# Altium footprint library Power_Lib_Altium.PcbLib: 383 footprints (part 3 of 24)
Each footprint in its own frame and in the unit in brackets; x right, y up, seen from the top. Pads: shape width x height; smd on the part's side, far side on the other; paste and mask are expansions set on the pad; w line width, h text height; cw(c..) or ccw(c..) is an arc to the next point about the centre after c.
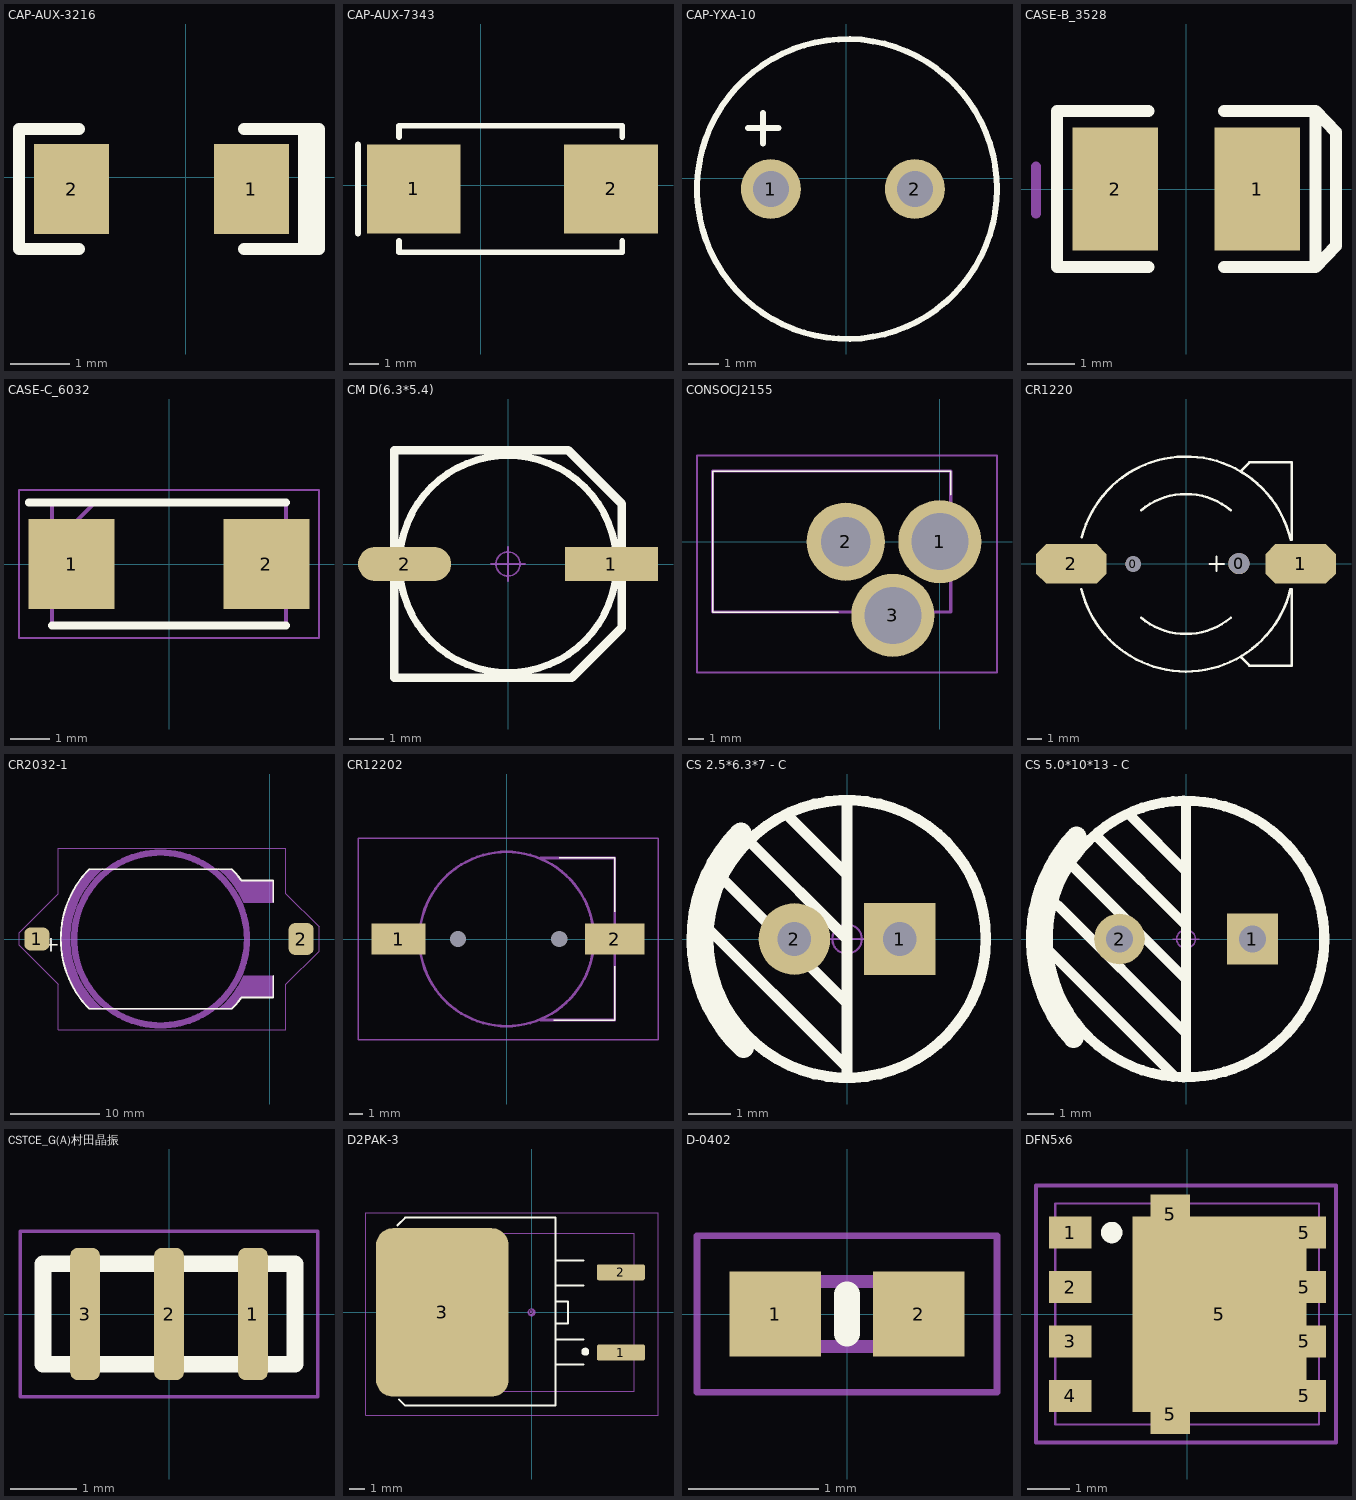
[diagram p2: the footprints below, top view; thin cyan lines are the x and y axes]

## CAP-AUX-3216 [mil] "钽电容1206大小"
pads (2):
  rect 50x60 smd: 1(44,-8) 2(-76,-8)
Top Overlay:
  lines w7.87: -111,-48 -71,-48 ; -111,32 -71,32 ; 39,-48 89,-48 ; 39,32 89,32
  lines w8: -111,-48 -111,32 ; 79,-48 79,32 ; 84,-48 84,32 ; 89,-48 89,32
3D body "User Library-CAP_TANT_3216-18_A_case-1.SLDPRT": height 66.93, standoff 0, extent -81.93,-45 51.93,25.87

## CAP-AUX-7343 [mm] "贴片7343钽电容"
pads (2):
  rect 3.2x3.05 smd: 1(-2.286,-0.127) 2(4.445,-0.127)
Top Overlay:
  lines w0.2: -4.191,-1.651 -4.191,1.397 ; -2.794,-1.905 -2.794,-2.286 4.826,-2.286 4.826,-1.905 ; -2.794,1.651 -2.794,2.032 4.826,2.032 4.826,1.651
3D body "User Library-AVX_E_CASE.SLDPRT": height 4.2, standoff 0, extent -2.684,-2.352 4.716,2.098

## CAP-YXA-10 [mm]
pads (2):
  round 2 hole 1.2: 1(-2.515,-0.356) 2(2.285,-0.356)
Top Overlay:
  circle w0.2: c0.025,-0.356 r5
  lines w0.2: -3.277,1.676 -2.261,1.676 ; -2.769,1.168 -2.769,2.184

## CASE-B_3528 [mm]
pads (2):
  rect 1.8x2.6 smd: 1(1.5,0) 2(-1.5,0)
Top Overlay:
  lines w0.254: -0.8,-1.65 -2.727,-1.65 -2.727,1.65 -0.8,1.65 ; 0.8,-1.65 2.727,-1.65 ; 0.8,1.65 2.727,1.65 ; 2.727,-1.65 3.163,-1.2 3.163,1.2 2.727,1.65 ; 2.727,-1.65 2.727,1.65
Mechanical 15:
  lines w0.203: -3.175,-0.525 -3.175,0.475
3D body "User Library-AVX_BCASE.STEP": height 2.03, standoff 0, extent -1.85,-1.465 1.85,1.465

## CASE-C_6032 [mm]
pads (2):
  rect 2.2x2.3 smd: 1(-2.5,0) 2(2.5,0)
Top Overlay:
  lines w0.2: -3.6,1.575 3,1.575 ; -3,-1.575 3,-1.575
Mechanical 13:
  lines w0.1: -3,0.475 -1.9,1.575 ; -3,-1.575 3,-1.575 3,1.575 -3,1.575 -3,-1.575
Mechanical 15:
  lines w0.05: -3.85,-1.9 3.85,-1.9 3.85,1.9 -3.85,1.9 -3.85,-1.9
3D body "TAJC226K025RNJ.stp": height 2.8, standoff 0, extent -3,-1.575 3,1.575

## CM D(6.3*5.4) [mm] "贴片电解电容，直径6.3mm，高5.4mm"
height 5.4
pads (2):
  rect 2.7x1 smd: 1(3,0)
  oval 2.7x1 smd: 2(-3,0)
Top Overlay:
  circle w0.2: c0,0 r3.15
  lines w0.254: -3.3,-3.3 1.85,-3.3 3.3,-1.85 3.3,1.75 1.75,3.3 -3.3,3.3 -3.3,-3.3
Mechanical 15:
  circle w0.05: c0,0 r0.35
  lines w0.05: -0.5,0 0.5,0 ; 0,-0.5 0,0.5
3D body "CM D(6.3X5.4).STEP": height 5.4, standoff -0.01, extent -3.5,-3.3 3.5,3.3

## CONSOCJ2155 [mm]
pads (3):
  round 5.3 hole 3.64: 1(0,0) 3(-3,-4.7)
  round 5 hole 3.162: 2(-6,0)
Top Overlay:
  lines w0.1: -6.5,-4.5 -14.5,-4.5 -14.5,4.5 0.7,4.5 0.7,3
Mechanical 13:
  lines w0.2: -14.5,-4.5 -14.5,4.5 0.7,4.5 0.7,-4.5 -14.5,-4.5
Mechanical 15:
  lines w0.1: -15.5,-8.35 -15.5,5.5 3.65,5.5 3.65,-8.35 -15.5,-8.35
3D body "CON-SOCJ-2155.stp": height 11.1, standoff -5, extent -14.5,-6.42 1.72,4.5

## CR1220 [mm]
pads (4):
  round 1.1 hole 1.1: 0(-3.754,-0.012)
  round 1.5 hole 1.5: 0(3.746,0.012)
  oct 5x2.8 smd: 1(8.132,-0.01) 2(-8.132,-0.01)
Top Overlay:
  lines w0.152: 1.655,-0.01 2.671,-0.01 ; 2.163,-0.518 2.163,0.498
  lines w0.178: -7.411,-1.8 ccw(c-0.004,-0.012) -0.004,-7.632 ccw(c-0.004,-0.012) 7.404,-1.796 ; -7.38,1.9 cw(c-0.004,-0.012) 7.417,1.72 ; -3.176,-3.825 ccw(c-0.004,-0.012) 3.165,-3.827 ; -3.176,3.8 cw(c-0.004,-0.012) 3.171,3.797 ; 3.896,-6.613 4.496,-7.213 7.496,-7.213 7.496,-1.796 ; 3.921,6.613 4.496,7.187 7.496,7.187 7.496,1.72

## CR2032-1 [mil]
pads (2):
  rrect50% 110x100 smd: 1(-1023.62,0)
  rrect50% 110x140 smd: 2(137.8,0)
Top Overlay:
  lines w8: 15.61,-161.42 15.61,-256.94 -124.05,-256.94 cw(c-480,0) -166.24,-307.01 -793.76,-307.01 cw(c-480,0) -793.76,307.01 -166.24,307.01 cw(c-480,0) -124.08,256.94 15.61,256.94 15.61,161.42
  text "+" at -921.42,28.01 h118.11
Mechanical 13:
  circle w28: c-480,0 r380
  region: -114.46,161.44 -119.25,171.88 -129.72,192.33 -141.35,212.14 -154.1,231.25 -167.93,249.6 -182.79,267.12 -198.63,283.76 -215.41,299.46 -224.12,306.94 -224.12,306.87 -166.24,306.87 -166.24,307.01 -160.51,301.16 -149.5,289.03 -138.95,276.5 -128.87,263.58 -124.08,256.94 15.61,256.94 15.61,161.42
  region: -793.76,-307.01 -805.66,-294.85 -827.49,-268.77 -847.25,-241.08 -864.8,-211.94 -880.05,-181.53 -892.89,-150.03 -903.26,-117.64 -911.1,-84.53 -916.34,-50.92 -918.98,-17.01 -918.98,17.01 -916.34,50.92 -911.1,84.53 -903.26,117.64 -892.89,150.03 -880.04,181.53 -864.8,211.94 -847.25,241.08 -827.49,268.77 -805.65,294.85 -793.76,307.01 -735.88,307.01 -735.88,306.94 -749.07,295.44 -773.88,270.77 -796.44,244.03 -816.58,215.41 -834.13,185.14 -848.97,153.46 -860.98,120.59 -870.06,86.8 -876.16,52.35 -879.22,17.49 -879.22,-17.49 -876.16,-52.35 -870.06,-86.8 -860.98,-120.59 -848.97,-153.46 -834.13,-185.14 -816.58,-215.41 -796.44,-244.03 -773.88,-270.77 -749.07,-295.44 -735.88,-306.94 -735.88,-307.01
  region: -166.24,-307.01 -160.51,-301.15 -149.5,-289.02 -138.94,-276.49 -128.86,-263.57 -124.07,-256.93 -124.05,-256.94 15.61,-256.94 15.61,-161.42 -114.46,-161.42 -114.46,-161.44 -119.25,-171.88 -129.72,-192.33 -141.35,-212.14 -154.1,-231.25 -167.93,-249.6 -182.79,-267.12 -198.63,-283.76 -215.41,-299.46 -224.12,-306.94 -224.12,-307.01
  lines w2: -735.88,-306.94 cw(c-480,0) -735.88,306.94 ; -224.12,-306.94 ccw(c-480,0) -114.46,-161.44 ; -224.12,306.87 -166.24,306.87 ; -224.12,306.94 cw(c-480,0) -114.46,161.44 ; -224.12,307.01 -793.76,307.01 ccw(c-480,0) -793.76,-307.01 -224.12,-307.01 -166.24,-307.01 ccw(c-480,0) -124.07,-256.93 15.61,-256.94 15.61,-161.42 -114.46,-161.42 ; -166.24,307.01 cw(c-480,0) -124.08,256.94 15.61,256.94 15.61,161.42 -114.5,161.42
Mechanical 14:
  lines w2: -1102.36,-27.64 -930,-200 -930,-400 70,-400 70,-200 216.54,-53.46 216.54,53.46 70,200 70,400 -930,400 -930,200 -1102.36,27.64 -1102.36,-27.64
3D body "User Library-BLP2032M-G.STEP": height 191.34, standoff 0, extent -905.12,-297.24 30.32,297.25

## CR12202 [mm]
pads (4):
  rect 4x2.3 smd: 1(-8,0)
  rect 4.4x2.3 smd: 2(8,0)
  round 0.6 hole 1.2 unplated: MH1(-3.6,0) MH2(3.9,0)
Top Overlay:
  lines w0.1: 3.5,-6 8,-6 8,-2 ; 3.9,6 8,6 8,2
Mechanical 13:
  lines w0.2: 2.5,-6 8,-6 8,6 2.5,6 ; 0,-6.45 ccw(c0,0) 0,6.45 ccw(c0,0) 0,-6.45
Mechanical 15:
  lines w0.1: -11,-7.45 -11,7.45 11.2,7.45 11.2,-7.45 -11,-7.45

## CS 2.5*6.3*7 - C [mm] "脚距2.5mm , 直径6.3mm , 高7mm"
pads (2):
  rect 1.7x1.7 hole 0.8: 1(1.25,0)
  round 1.7 hole 0.8: 2(-1.25,0)
Top Overlay:
  circle w0.254: c0,0 r3.3
  lines w0.254: -3.556,0.508 0,-3.048 ; -3.048,1.524 0,-1.524 ; -2.286,2.286 0,0 ; -1.397,2.921 0,1.524 ; 0,-3.15 0,3.15
  lines w0.504: -2.521,2.521 ccw(c0,0) -2.459,-2.582
Mechanical 15:
  circle w0.05: c0,0 r0.35
  lines w0.05: -0.5,0 0.5,0 ; 0,-0.5 0,0.5
3D body "CS 6.3X7.STEP": height 7.02, standoff -3.48, extent -3.15,-3.15 3.15,3.15

## CS 5.0*10*13 - C [mm] "脚距5mm , 直径10mm , 高13mm"
pads (2):
  rect 1.9x1.9 hole 1: 1(2.5,0)
  round 1.9 hole 1: 2(-2.5,0)
Top Overlay:
  circle w0.381: c0,0 r5.2
  lines w0.381: -5.08,-0.508 -0.508,-5.08 ; -5.08,1.27 -4.826,1.27 0,-3.556 ; -4.318,2.794 0,-1.524 ; -3.302,3.81 0,0.508 0,1.016 ; -2.032,4.572 0,2.54 ; 0,-5 0,5
  lines w0.75: -4.229,-3.731 cw(c0,0) -4.114,3.857
Mechanical 15:
  circle w0.05: c0,0 r0.35
  lines w0.05: -0.5,0 0.5,0 ; 0,-0.5 0,0.5
3D body "CS 10X13.STEP": height 13.02, standoff -3.48, extent -5,-5 5,5

## CSTCE_G(A)村田晶振 [mm]
pads (3):
  rrect50% 0.45x2 smd: 1(1.27,0) 2(0,0) 3(-1.27,0)
Top Overlay:
  lines w0.254: -1.905,-0.762 -1.905,0.762 1.905,0.762 1.905,-0.762 -1.905,-0.762
Mechanical 13:
  lines w0.051: -0.127,0 0.127,0 ; 0,-0.127 0,0.127 ; -1.9,-0.8 -1.9,0.8 1.9,0.8 1.9,-0.8 -1.9,-0.8
Mechanical 14:
  lines w0.051: -2.25,-1.25 -2.25,1.25 2.25,1.25 2.25,-1.25 -2.25,-1.25
3D body: height 1, standoff 0, extent -1.9,-0.8 1.9,0.8

## D2PAK-3 [mil] "D-PAK/TO-263-3; 3 Leads (1 Cropped); Body 14.7 (inc. leads) x 10.2 mm (LxW max)"
height 180
pads (4):
  round 20 on Mech15: 0(0,0)
  rrect25% 120x40 smd: 1(222.5,-100) 2(222.5,100)
  rrect25% 330x420 smd: 3(-222.5,0)
Top Overlay:
  circle w9.84: c133.8,-97.83 r4.92
  lines w5: -334.65,216.54 -314.96,236.22 59.06,236.22 59.06,-232.28 -314.96,-232.28 -330.71,-216.54 ; 129.92,-129.92 59.06,-129.92 59.06,-66.93 129.92,-66.93 ; 129.92,66.93 59.06,66.93 59.06,129.92 129.92,129.92 ; 59.06,-27.56 59.06,27.56 90.55,27.56 90.55,-27.56 59.06,-27.56
Mechanical 13:
  lines w3: -361.41,-196.85 255.51,-196.85 255.51,196.85 -361.41,196.85 -361.41,-196.85
Mechanical 15:
  lines w3: -413.39,-255.91 -413.39,248.03 314.96,248.03 314.96,-255.91 -413.39,-255.91
3D body "SW3dPS-TO263-3S.STEP": height 189.36, standoff 0.39, extent -361.41,-196.85 255.51,196.85

## D-0402 [mm]
pads (2):
  rect 0.7x0.65 smd: 1(-0.55,0) 2(0.55,0)
Top Overlay:
  lines w0.2: 0,-0.15 0,0.15
Mechanical 13:
  lines w0.1: -0.5,-0.25 -0.5,0.25 0.5,0.25 0.5,-0.25 -0.5,-0.25
Mechanical 15:
  lines w0.05: -1.15,-0.6 -1.15,0.6 1.15,0.6 1.15,-0.6 -1.15,-0.6
3D body "PESD0402-140.stp": height 0.43, standoff 0, extent -0.5,-0.25 0.5,0.25

## DFN5x6 [mm]
pads (11):
  rect 1x0.75 smd: 1(-2.73,1.905) 2(-2.73,0.635) 3(-2.73,-0.635) 4(-2.73,-1.905) 5(2.73,-1.905) 5(2.73,-0.635) 5(2.73,0.635) 5(2.73,1.905)
  rect 0.92x0.905 smd: 5(-0.394,-2.337) 5(-0.394,2.337)
  rect 4.055x4.56 smd: 5(0.749,0)
Top Overlay:
  circle w0.25: c-1.765,1.905 r0.125
Mechanical 13:
  lines w0.051: -0.254,0 0.254,0 ; 0,-0.254 0,0.254 ; -3.08,-2.57 3.07,-2.57 3.07,2.58 -3.08,2.58 -3.08,-2.57
Mechanical 14:
  lines w0.1: -3.531,-2.995 -3.531,3.005 3.47,3.005 3.47,-2.995 -3.531,-2.995
Mechanical 15:
  lines w0.1: -0.5,0 0.5,0 ; 0,-0.5 0,0.5
3D body "DFN5x6_SO8FL.STEP": height 1.12, standoff -0.01, extent -3.08,-2.57 3.07,2.58